# Altium footprint library 2 (1).PcbLib: 21 footprints (part 1 of 2)
Each footprint in its own frame and in the unit in brackets; x right, y up, seen from the top. Pads: shape width x height; smd on the part's side, far side on the other; paste and mask are expansions set on the pad; w line width, h text height; cw(c..) or ccw(c..) is an arc to the next point about the centre after c.
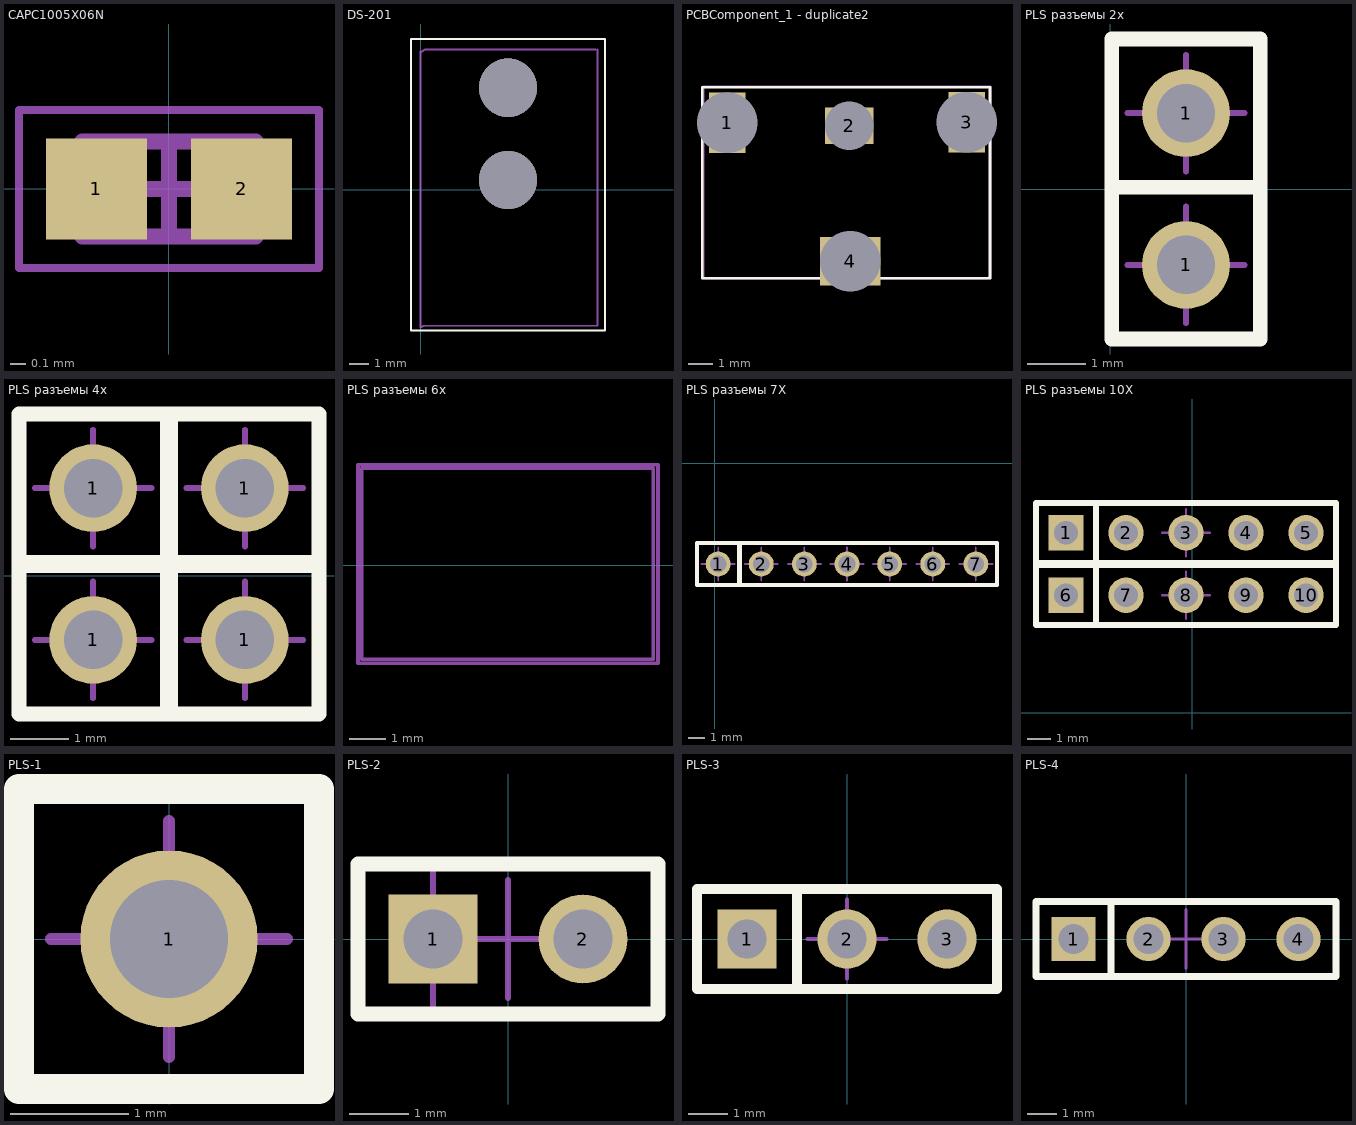
[diagram p0: the footprints below, top view; thin cyan lines are the x and y axes]

## CAPC1005X06N [mm] "Chip Capacitor, 2-Leads, Body 1,00x0,50mm, IPC Medium Density"
height 0.6
pads (2):
  rect 0.64x0.64 smd: 1(-0.46,0) 2(0.46,0)
Mechanical 13:
  lines w0.1: -0.55,-0.3 0.55,-0.3 0.55,0.3 -0.55,0.3 -0.55,-0.3
Mechanical 15:
  lines w0.05: -0.95,-0.5 0.95,-0.5 0.95,0.5 -0.95,0.5 -0.95,-0.5
  lines w0.1: -0.3,0 0.3,0 ; 0,-0.3 0,0.3
3D body: height 0.6, standoff 0, extent 0.35,-0.3 0.55,0.3
3D body: height 0.6, standoff 0, extent -0.55,-0.3 -0.35,0.3
3D body: height 0.6, standoff 0, extent -0.35,-0.3 0.35,0.3

## DS-201 [mm]
via 4.5,5.25 diameter 3 hole 3
via 4.5,0.5 diameter 3 hole 3
Top Overlay:
  lines w0.1: -0.5,-7.25 -0.5,7.75 9.5,7.75 9.5,-7.25 9.25,-7.25 -0.5,-7.25
Mechanical 15:
  lines w0.1: 0,6 0,6.9 ; 9,7.2 0.241,7.2 ccw(c0.241,7.1) 0.171,7.171 cw(c0,7.341) 0,7.1 0,0 0,-7.1 cw(c0.241,-7.341) 0.241,-7 9.1,-7 9.1,0.1 9.1,7.2

## MSOP-10 [mm]

## PCBComponent_1 [mm]
3D body "User Library-arduino_nano.STEP": height 1.38, standoff -16.62, extent -6.32,-8.8 38.68,9.8

## PCBComponent_1 - duplicate [mm]

## PCBComponent_1 - duplicate1 [mm]

## PCBComponent_1 - duplicate2 [mm]
pads (4):
  rect 1.5x2.5 hole 2.5 square: 1(289.925,-24.775) 3(299.825,-24.75)
  rect 2x1.5 hole 2 square: 2(294.975,-24.9)
  rect 2.5x2 hole 2.5 square: 4(295,-30.5)
Top Overlay:
  lines w0.1: 300.775,-31.2 300.775,-23.3 ; 300.775,-23.45 cw(c300.775,-23.475) 300.8,-23.475 ; 288.9,-31.2 300.8,-31.2 300.8,-23.3 288.9,-23.3 288.9,-31.2
Mechanical 15:
  lines w0.1: 289.175,-31.2 300.7,-31.2 300.8,-31.101 300.8,-23.275 ; 289.187,-31.2 288.925,-31.2 ; 300.8,-31.2 300.8,-31.2 300.8,-23.275 ; 288.925,-31.2 288.925,-31.2 ; 288.925,-31.2 288.925,-23.275 300.8,-23.275
3D body "User Library-RS-101(RCA-107).STEP": height 12, standoff -5.25, extent 289.35,-39.15 300.525,-23.65

## PLS разъемы 2x [mm]
pads (2):
  round 1.5 hole 1: 1(1.3,-1.3) 1(1.3,1.3)
Top Overlay:
  lines w0.25: 0.03,-0.03 0.03,-2.57 2.57,-2.57 2.57,-0.03 ; 0.03,0.03 0.03,2.57 2.57,2.57 2.57,0.03 0.03,0.03
Mechanical 13:
  lines w0.1: 0.03,-2.57 0.03,-0.03 2.57,-0.03 2.57,-2.57 0.03,-2.57 ; 0.03,0.03 0.03,2.57 2.57,2.57 2.57,0.03 0.03,0.03
Mechanical 15:
  lines w0.1: 0.3,-1.3 2.3,-1.3 ; 0.3,1.3 2.3,1.3 ; 1.3,-2.3 1.3,-0.3 ; 1.3,0.3 1.3,2.3 ; 0.03,-2.57 0.03,-0.03 2.57,-0.03 2.57,-2.57 0.03,-2.57 ; 0.03,0.03 0.03,2.57 2.57,2.57 2.57,0.03 0.03,0.03
3D body: height 2, standoff 0, extent 0.05,0.05 2.55,2.55
3D body: height 9, standoff -1, extent 1,1 1.6,1.6
3D body: height 2, standoff 0, extent 0.05,-2.55 2.55,-0.05
3D body: height 9, standoff -1, extent 1,-1.6 1.6,-1

## PLS разъемы 4x [mm]
pads (4):
  round 1.5 hole 1: 1(2.3,-1.1) 1(2.3,1.5) 1(4.9,-1.1) 1(4.9,1.5)
Top Overlay:
  lines w0.25: 1.03,-2.37 1.03,0.17 3.57,0.17 3.57,-2.37 1.03,-2.37 ; 1.03,0.23 1.03,2.77 3.57,2.77 3.57,0.23 1.03,0.23 ; 3.63,-2.37 3.63,0.17 6.17,0.17 6.17,-2.37 3.63,-2.37 ; 3.63,0.23 3.63,2.77 6.17,2.77 6.17,0.23 3.63,0.23
Mechanical 13:
  lines w0.1: 1.03,-2.37 3.57,-2.37 3.57,0.17 1.03,0.17 1.03,-2.37 ; 1.03,0.23 3.57,0.23 3.57,2.77 1.03,2.77 1.03,0.23 ; 3.63,-2.37 6.17,-2.37 6.17,0.17 3.63,0.17 3.63,-2.37 ; 3.63,0.23 6.17,0.23 6.17,2.77 3.63,2.77 3.63,0.23
Mechanical 15:
  lines w0.1: 1.3,-1.1 3.3,-1.1 ; 1.3,1.5 3.3,1.5 ; 2.3,-2.1 2.3,-0.1 ; 2.3,0.5 2.3,2.5 ; 3.9,-1.1 5.9,-1.1 ; 3.9,1.5 5.9,1.5 ; 4.9,-2.1 4.9,-0.1 ; 4.9,0.5 4.9,2.5 ; 1.03,-2.37 3.57,-2.37 3.57,0.17 1.03,0.17 1.03,-2.37 ; 1.03,0.23 3.57,0.23 3.57,2.77 1.03,2.77 1.03,0.23 ; 3.63,-2.37 6.17,-2.37 6.17,0.17 3.63,0.17 3.63,-2.37 ; 3.63,0.23 6.17,0.23 6.17,2.77 3.63,2.77 3.63,0.23
3D body: height 2, standoff 0, extent 1.05,-2.35 3.55,0.15
3D body: height 9, standoff -1, extent 2,-1.4 2.6,-0.8
3D body: height 2, standoff 0, extent 3.65,-2.35 6.15,0.15
3D body: height 9, standoff -1, extent 4.6,-1.4 5.2,-0.8
3D body: height 2, standoff 0, extent 3.65,0.25 6.15,2.75
3D body: height 9, standoff -1, extent 4.6,1.2 5.2,1.8
3D body: height 2, standoff 0, extent 1.05,0.25 3.55,2.75
3D body: height 9, standoff -1, extent 2,1.2 2.6,1.8

## PLS разъемы 6x [mm]
Size:
  lines w0.1: 0.75,-2.65 8.865,-2.65 8.865,2.725 0.75,2.725 0.75,-2.65
Border:
  lines w0.1: 0.85,-2.54 0.85,2.625 8.738,2.625 8.738,-2.54 0.85,-2.54
3D body "User Library-DS1021.STEP": height 8.6, standoff -3, extent 3.555,0 6.095,2.54
3D body "User Library-DS1021.STEP": height 8.6, standoff -3, extent 1.016,0 3.556,2.54
3D body "User Library-DS1021.STEP": height 8.6, standoff -3, extent 1.016,-2.54 3.556,0
3D body "User Library-DS1021.STEP": height 8.6, standoff -3, extent 3.556,-2.54 6.096,0
3D body "User Library-DS1021.STEP": height 8.6, standoff -3, extent 6.096,0 8.636,2.54
3D body "User Library-DS1021.STEP": height 8.6, standoff -3, extent 6.096,-2.54 8.636,0

## PLS разъемы 7Х [mm]
pads (7):
  round 1.5 hole 1: 1(0.203,-6.071) 2(2.794,-6.071) 3(5.385,-6.071) 4(7.95,-6.071) 5(10.516,-6.071) 6(13.106,-6.071) 7(15.697,-6.071)
Top Overlay:
  lines w0.25: 4.064,-7.341 1.524,-7.341 1.524,-4.801 4.064,-4.801 ; 4.115,-7.341 6.655,-7.341 ; 4.115,-4.801 6.655,-4.801 ; 6.68,-7.341 9.22,-7.341 ; 6.68,-4.801 9.22,-4.801 ; 9.246,-7.341 11.786,-7.341 ; 9.246,-4.801 11.786,-4.801 ; 11.836,-7.341 14.376,-7.341 ; 11.836,-4.801 14.376,-4.801 ; 14.427,-7.341 16.967,-7.341 16.967,-4.801 14.427,-4.801 ; -1.067,-7.341 1.473,-7.341 1.473,-4.801 -1.067,-4.801 -1.067,-7.341
Mechanical 13:
  lines w0.1: 4.064,-7.341 1.524,-7.341 1.524,-4.801 4.064,-4.801 ; 4.115,-7.341 6.655,-7.341 ; 4.115,-4.801 6.655,-4.801 ; 6.68,-7.341 9.22,-7.341 ; 6.68,-4.801 9.22,-4.801 ; 9.246,-7.341 11.786,-7.341 ; 9.246,-4.801 11.786,-4.801 ; 11.836,-7.341 14.376,-7.341 ; 11.836,-4.801 14.376,-4.801 ; 14.427,-7.341 16.967,-7.341 16.967,-4.801 14.427,-4.801 ; -1.067,-7.341 -1.067,-4.801 1.473,-4.801 1.473,-7.341 -1.067,-7.341
Mechanical 15:
  lines w0.1: -0.797,-6.071 1.203,-6.071 ; 0.203,-7.071 0.203,-5.071 ; 1.794,-6.071 3.794,-6.071 ; 2.794,-7.071 2.794,-5.071 ; 4.064,-7.341 1.524,-7.341 1.524,-4.801 4.064,-4.801 ; 4.115,-7.341 6.655,-7.341 ; 4.115,-4.801 6.655,-4.801 ; 4.385,-6.071 6.385,-6.071 ; 5.385,-7.071 5.385,-5.071 ; 6.68,-7.341 9.22,-7.341 ; 6.68,-4.801 9.22,-4.801 ; 6.95,-6.071 8.95,-6.071 ; 7.95,-7.071 7.95,-5.071 ; 9.246,-7.341 11.786,-7.341 ; 9.246,-4.801 11.786,-4.801 ; 9.516,-6.071 11.516,-6.071 ; 10.516,-7.071 10.516,-5.071 ; 11.836,-7.341 14.376,-7.341 ; 11.836,-4.801 14.376,-4.801 ; 12.106,-6.071 14.106,-6.071 ; 13.106,-7.071 13.106,-5.071 ; 14.427,-7.341 16.967,-7.341 16.967,-4.801 14.427,-4.801 ; 14.697,-6.071 16.697,-6.071 ; 15.697,-7.071 15.697,-5.071 ; -1.067,-7.341 -1.067,-4.801 1.473,-4.801 1.473,-7.341 -1.067,-7.341
3D body: height 9, standoff -1, extent -0.097,-6.371 0.503,-5.771
3D body: height 2, standoff 0, extent -1.047,-7.321 1.453,-4.821
3D body: height 9, standoff -1, extent 2.494,-6.371 3.094,-5.771
3D body: height 2, standoff 0, extent 1.544,-7.321 4.044,-4.821
3D body: height 9, standoff -1, extent 5.085,-6.371 5.685,-5.771
3D body: height 2, standoff 0, extent 4.135,-7.321 6.635,-4.821
3D body: height 9, standoff -1, extent 7.65,-6.371 8.25,-5.771
3D body: height 2, standoff 0, extent 6.7,-7.321 9.2,-4.821
3D body: height 9, standoff -1, extent 10.216,-6.371 10.816,-5.771
3D body: height 2, standoff 0, extent 9.266,-7.321 11.766,-4.821
3D body: height 9, standoff -1, extent 12.806,-6.371 13.406,-5.771
3D body: height 2, standoff 0, extent 11.856,-7.321 14.356,-4.821
3D body: height 9, standoff -1, extent 15.397,-6.371 15.997,-5.771
3D body: height 2, standoff 0, extent 14.447,-7.321 16.947,-4.821

## PLS разъемы 10Х [mm]
pads (10):
  rect 1.5x1.5 hole 1: 1(-5.335,7.611) 6(-5.335,4.969)
  round 1.5 hole 1: 2(-2.795,7.611) 3(-0.255,7.611) 4(2.285,7.611) 5(4.825,7.611) 7(-2.795,4.969) 8(-0.255,4.969) 9(2.285,4.969) 10(4.825,4.969)
Top Overlay:
  lines w0.25: -4.065,3.699 -4.065,6.239 ; -4.065,6.341 -4.065,8.881 ; -6.605,3.699 6.095,3.699 6.095,6.239 -6.605,6.239 -6.605,3.699 ; -6.605,6.341 6.095,6.341 6.095,8.881 -6.605,8.881 -6.605,6.341
Mechanical 13:
  lines w0.1: -4.065,3.699 -4.065,6.239 ; -4.065,6.341 -4.065,8.881 ; -6.605,3.699 -6.605,6.239 6.095,6.239 6.095,3.699 -6.605,3.699 ; -6.605,6.341 -6.605,8.881 6.095,8.881 6.095,6.341 -6.605,6.341
Mechanical 15:
  lines w0.1: -1.255,4.969 0.745,4.969 ; -1.255,7.611 0.745,7.611 ; -0.255,3.969 -0.255,5.969 ; -0.255,6.611 -0.255,8.611 ; -6.605,3.699 6.095,3.699 6.095,6.239 -6.605,6.239 -6.605,3.699 ; -6.605,6.341 6.095,6.341 6.095,8.881 -6.605,8.881 -6.605,6.341
3D body "PLS-5.STEP": height 8.9, standoff -2.9, extent -6.605,6.341 6.095,8.881
3D body "PLS-5.STEP": height 8.9, standoff -2.9, extent -6.605,3.699 6.095,6.239

## PLS-1 [mm]
height 10
pads (1):
  round 1.5 hole 1: 1(0,0)
Top Overlay:
  lines w0.25: -1.27,-1.27 -1.27,1.27 1.27,1.27 1.27,-1.27 -1.27,-1.27
Mechanical 13:
  lines w0.1: -1.27,-1.27 1.27,-1.27 1.27,1.27 -1.27,1.27 -1.27,-1.27
Mechanical 15:
  lines w0.1: -1,0 1,0 ; 0,-1 0,1 ; -1.27,-1.27 1.27,-1.27 1.27,1.27 -1.27,1.27 -1.27,-1.27
3D body: height 2, standoff 0, extent -1.25,-1.25 1.25,1.25
3D body: height 9, standoff -1, extent -0.3,-0.3 0.3,0.3

## PLS-2 [mm]
height 10
pads (2):
  rect 1.5x1.5 hole 1: 1(-1.27,0)
  round 1.5 hole 1: 2(1.27,0)
Top Overlay:
  lines w0.25: -2.54,-1.27 2.54,-1.27 2.54,1.27 -2.54,1.27 -2.54,-1.27
Mechanical 13:
  lines w0.1: -1.27,-1.27 -1.27,1.27 ; -2.54,-1.27 2.54,-1.27 2.54,1.27 -2.54,1.27 -2.54,-1.27
Mechanical 15:
  lines w0.1: -1,0 1,0 ; 0,-1 0,1 ; -2.54,-1.27 -2.54,1.27 2.54,1.27 2.54,-1.27 -2.54,-1.27
3D body "PLS-2.STEP": height 8.9, standoff -2.9, extent -2.54,-1.27 2.54,1.27

## PLS-3 [mm]
height 10
pads (3):
  rect 1.5x1.5 hole 1: 1(-2.54,0)
  round 1.5 hole 1: 2(0,0) 3(2.54,0)
Top Overlay:
  lines w0.25: -1.27,-1.27 -1.27,1.27 ; -3.81,-1.27 -3.81,1.27 3.81,1.27 3.81,-1.27 -3.81,-1.27
Mechanical 13:
  lines w0.1: -1.27,-1.27 -1.27,1.27 ; -3.81,-1.27 3.81,-1.27 3.81,1.27 -3.81,1.27 -3.81,-1.27
Mechanical 15:
  lines w0.1: -1,0 1,0 ; 0,-1 0,1 ; -3.81,-1.27 -3.81,1.27 3.81,1.27 3.81,-1.27 -3.81,-1.27
3D body "PLS-3.STEP": height 8.9, standoff -2.9, extent -3.81,-1.27 3.81,1.27

## PLS-4 [mm]
height 10
pads (4):
  rect 1.5x1.5 hole 1: 1(-3.81,0)
  round 1.5 hole 1: 2(-1.27,0) 3(1.27,0) 4(3.81,0)
Top Overlay:
  lines w0.25: -2.54,-1.27 -2.54,1.27 ; -5.08,-1.27 5.08,-1.27 5.08,1.27 -5.08,1.27 -5.08,-1.27
Mechanical 13:
  lines w0.1: -2.54,-1.27 -2.54,1.27 ; -5.08,-1.27 -5.08,1.27 5.08,1.27 5.08,-1.27 -5.08,-1.27
Mechanical 15:
  lines w0.1: -1,0 1,0 ; 0,-1 0,1 ; -5.08,-1.27 5.08,-1.27 5.08,1.27 -5.08,1.27 -5.08,-1.27
3D body "PLS-4.STEP": height 8.9, standoff -2.9, extent -5.08,-1.27 5.08,1.27